# Altium footprint library мс отечественные.PcbLib: 15 footprints
Each footprint in its own frame and in the unit in brackets; x right, y up, seen from the top. Pads: shape width x height; smd on the part's side, far side on the other; paste and mask are expansions set on the pad; w line width, h text height; cw(c..) or ccw(c..) is an arc to the next point about the centre after c.
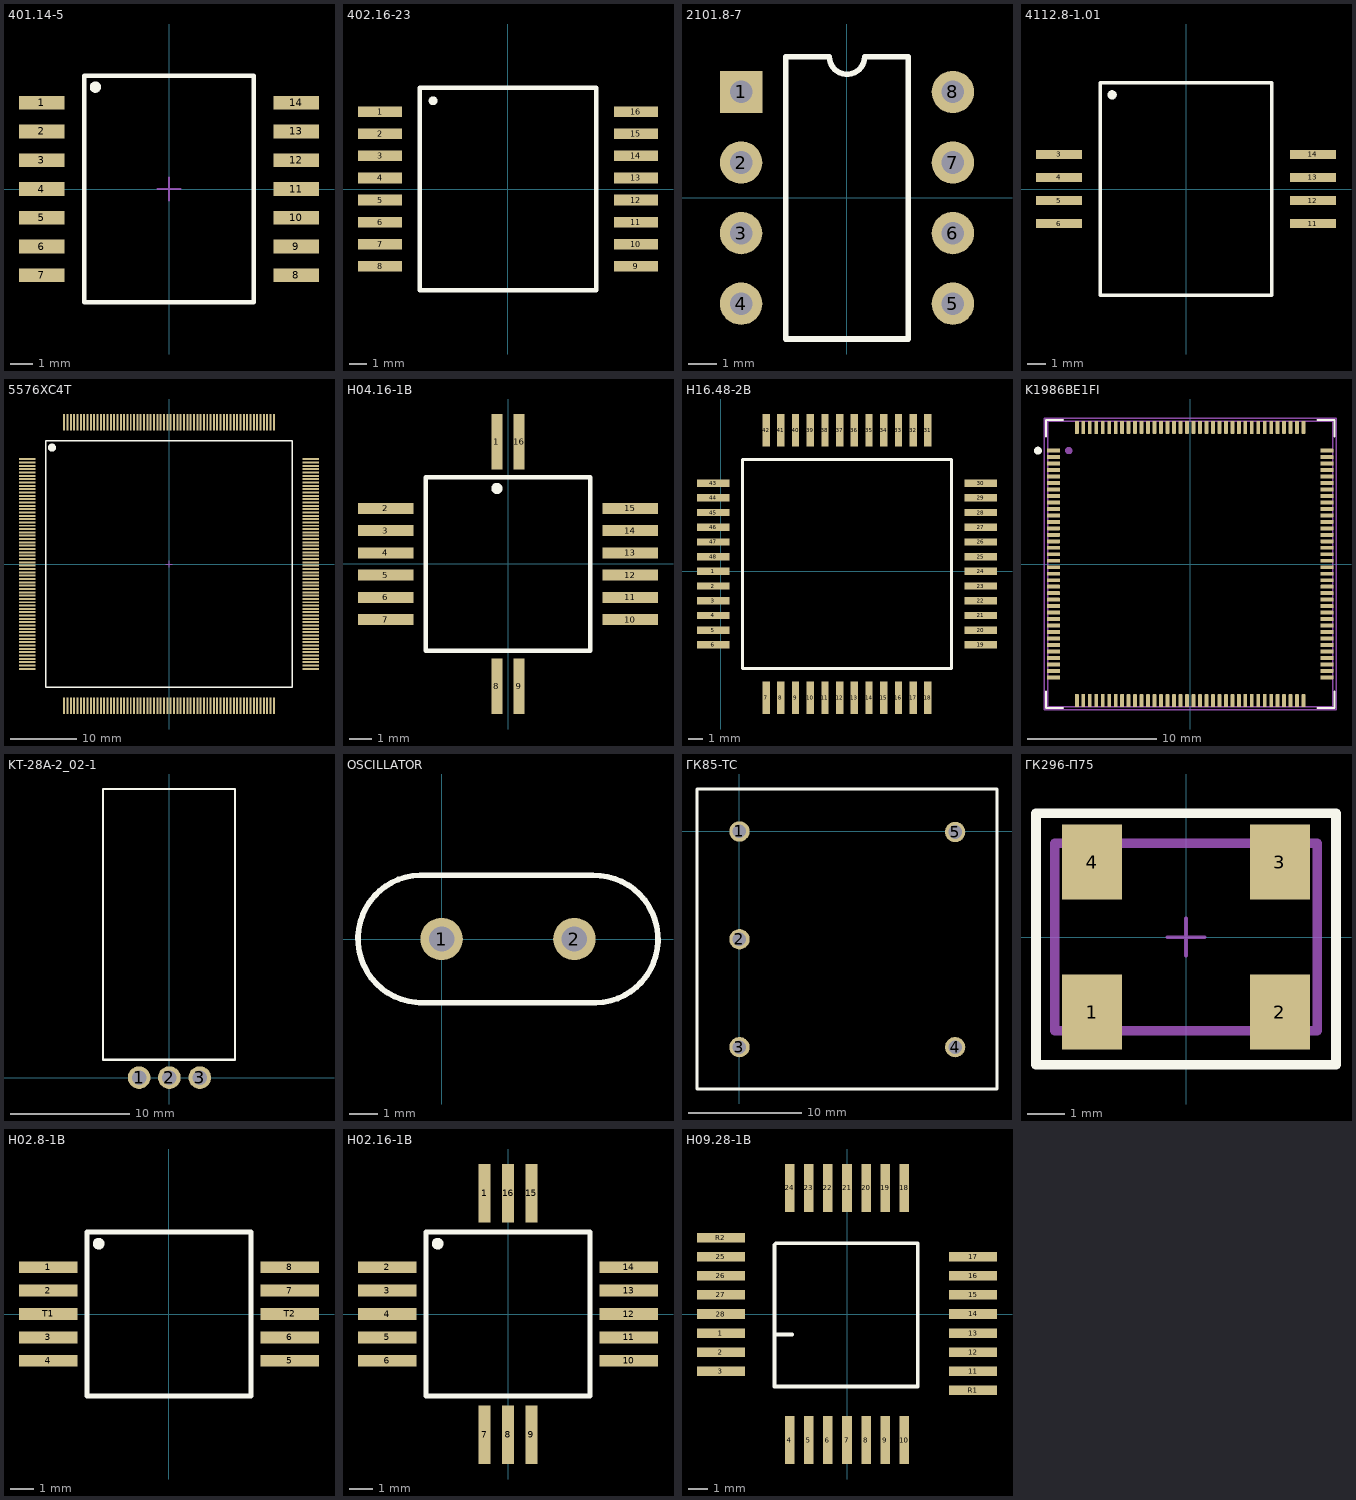
[diagram p0: the footprints below, top view; thin cyan lines are the x and y axes]

## 401.14-5 [mm]
pads (14):
  rect 2x0.6 smd: 1(-5.625,3.81) 2(-5.625,2.54) 3(-5.625,1.27) 4(-5.625,0) 5(-5.625,-1.27) 6(-5.625,-2.54) 7(-5.625,-3.81) 8(5.625,-3.81) 9(5.625,-2.54) 10(5.625,-1.27) 11(5.625,0) 12(5.625,1.27) 13(5.625,2.54) 14(5.625,3.81)
Top Overlay:
  circle w0.25: c-3.25,4.5 r0.125
  lines w0.2: -3.75,-5 -3.75,5 3.75,5 3.75,-5 -3.75,-5
Mechanical 15:
  lines w0.1: -0.5,0 0.5,0 ; 0,-0.5 0,0.5
3D body "401.14-5.STEP": height 2.65, standoff 0, extent -6.126,-5 6.125,5

## 402.16-23 [mm]
pads (16):
  rect 2.5x0.6 smd: 1(-7.25,4.375) 2(-7.25,3.125) 3(-7.25,1.875) 4(-7.25,0.625) 5(-7.25,-0.625) 6(-7.25,-1.875) 7(-7.25,-3.125) 8(-7.25,-4.375) 9(7.25,-4.375) 10(7.25,-3.125) 11(7.25,-1.875) 12(7.25,-0.625) 13(7.25,0.625) 14(7.25,1.875) 15(7.25,3.125) 16(7.25,4.375)
Top Overlay:
  circle w0.25: c-4.25,5 r0.125
  lines w0.254: -5,-5.75 5,-5.75 5,5.75 -5,5.75 -5,-5.75
3D body "402_16.STEP": height 2.51, standoff 0, extent -7.25,-5.75 7.25,5.75

## 2101.8-7 [mm]
pads (8):
  rect 1.5x1.5 hole 0.8: 1(-3.75,3.75)
  round 1.5 hole 0.8: 2(-3.75,1.25) 3(-3.75,-1.25) 4(-3.75,-3.75) 5(3.75,-3.75) 6(3.75,-1.25) 7(3.75,1.25) 8(3.75,3.75)
Top Overlay:
  lines w0.2: -2.165,-5 -2.165,5 -0.625,5 ccw(c0,5) 0.625,5 2.165,5 2.165,-5 -2.165,-5
3D body "2101.8-7.STEP": height 4.89, standoff -2.31, extent -3.91,-5 3.91,5

## 4112.8-1.01 [mm]
pads (8):
  rect 2.5x0.5 smd: 3(-6.875,1.875) 4(-6.875,0.625) 5(-6.875,-0.625) 6(-6.875,-1.875) 11(6.875,-1.875) 12(6.875,-0.625) 13(6.875,0.625) 14(6.875,1.875)
Top Overlay:
  circle w0.25: c-4,5.1 r0.125
  lines w0.2: -4.65,-5.75 4.65,-5.75 4.65,5.75 -4.65,5.75 -4.65,-5.75
3D body "4112_8-1_01.STEP": height 2.51, standoff 0.01, extent -7.15,-5.75 7.15,5.75

## 5576XC4T [mm]
pads (256):
  rect 2.5x0.3 smd: 1(-21.3,15.75) 2(-21.3,15.25) 3(-21.3,14.75) 4(-21.3,14.25) 5(-21.3,13.75) 6(-21.3,13.25) 7(-21.3,12.75) 8(-21.3,12.25) 9(-21.3,11.75) 10(-21.3,11.25) 11(-21.3,10.75) 12(-21.3,10.25) 13(-21.3,9.75) 14(-21.3,9.25) 15(-21.3,8.75) 16(-21.3,8.25) 17(-21.3,7.75) 18(-21.3,7.25) 19(-21.3,6.75) 20(-21.3,6.25) 21(-21.3,5.75) 22(-21.3,5.25) 23(-21.3,4.75) 24(-21.3,4.25) 25(-21.3,3.75) 26(-21.3,3.25) 27(-21.3,2.75) 28(-21.3,2.25) 29(-21.3,1.75) 30(-21.3,1.25) 31(-21.3,0.75) 32(-21.3,0.25) 33(-21.3,-0.25) 34(-21.3,-0.75) 35(-21.3,-1.25) 36(-21.3,-1.75) 37(-21.3,-2.25) 38(-21.3,-2.75) 39(-21.3,-3.25) 40(-21.3,-3.75) 41(-21.3,-4.25) 42(-21.3,-4.75) 43(-21.3,-5.25) 44(-21.3,-5.75) 45(-21.3,-6.25) 46(-21.3,-6.75) 47(-21.3,-7.25) 48(-21.3,-7.75) 49(-21.3,-8.25) 50(-21.3,-8.75) 51(-21.3,-9.25) 52(-21.3,-9.75) 53(-21.3,-10.25) 54(-21.3,-10.75) 55(-21.3,-11.25) 56(-21.3,-11.75) 57(-21.3,-12.25) 58(-21.3,-12.75) 59(-21.3,-13.25) 60(-21.3,-13.75) 61(-21.3,-14.25) 62(-21.3,-14.75) 63(-21.3,-15.25) 64(-21.3,-15.75) 129(21.3,-15.75) 130(21.3,-15.25) 131(21.3,-14.75) 132(21.3,-14.25) 133(21.3,-13.75) 134(21.3,-13.25) 135(21.3,-12.75) 136(21.3,-12.25) 137(21.3,-11.75) 138(21.3,-11.25) 139(21.3,-10.75) 140(21.3,-10.25) 141(21.3,-9.75) 142(21.3,-9.25) 143(21.3,-8.75) 144(21.3,-8.25) 145(21.3,-7.75) 146(21.3,-7.25) 147(21.3,-6.75) 148(21.3,-6.25) 149(21.3,-5.75) 150(21.3,-5.25) 151(21.3,-4.75) 152(21.3,-4.25) 153(21.3,-3.75) 154(21.3,-3.25) 155(21.3,-2.75) 156(21.3,-2.25) 157(21.3,-1.75) 158(21.3,-1.25) 159(21.3,-0.75) 160(21.3,-0.25) 161(21.3,0.25) 162(21.3,0.75) 163(21.3,1.25) 164(21.3,1.75) 165(21.3,2.25) 166(21.3,2.75) 167(21.3,3.25) 168(21.3,3.75) 169(21.3,4.25) 170(21.3,4.75) 171(21.3,5.25) 172(21.3,5.75) 173(21.3,6.25) 174(21.3,6.75) 175(21.3,7.25) 176(21.3,7.75) 177(21.3,8.25) 178(21.3,8.75) 179(21.3,9.25) 180(21.3,9.75) 181(21.3,10.25) 182(21.3,10.75) 183(21.3,11.25) 184(21.3,11.75) 185(21.3,12.25) 186(21.3,12.75) 187(21.3,13.25) 188(21.3,13.75) 189(21.3,14.25) 190(21.3,14.75) 191(21.3,15.25) 192(21.3,15.75)
  rect 0.3x2.5 smd: 65(-15.75,-21.3) 66(-15.25,-21.3) 67(-14.75,-21.3) 68(-14.25,-21.3) 69(-13.75,-21.3) 70(-13.25,-21.3) 71(-12.75,-21.3) 72(-12.25,-21.3) 73(-11.75,-21.3) 74(-11.25,-21.3) 75(-10.75,-21.3) 76(-10.25,-21.3) 77(-9.75,-21.3) 78(-9.25,-21.3) 79(-8.75,-21.3) 80(-8.25,-21.3) 81(-7.75,-21.3) 82(-7.25,-21.3) 83(-6.75,-21.3) 84(-6.25,-21.3) 85(-5.75,-21.3) 86(-5.25,-21.3) 87(-4.75,-21.3) 88(-4.25,-21.3) 89(-3.75,-21.3) 90(-3.25,-21.3) 91(-2.75,-21.3) 92(-2.25,-21.3) 93(-1.75,-21.3) 94(-1.25,-21.3) 95(-0.75,-21.3) 96(-0.25,-21.3) 97(0.25,-21.3) 98(0.75,-21.3) 99(1.25,-21.3) 100(1.75,-21.3) 101(2.25,-21.3) 102(2.75,-21.3) 103(3.25,-21.3) 104(3.75,-21.3) 105(4.25,-21.3) 106(4.75,-21.3) 107(5.25,-21.3) 108(5.75,-21.3) 109(6.25,-21.3) 110(6.75,-21.3) 111(7.25,-21.3) 112(7.75,-21.3) 113(8.25,-21.3) 114(8.75,-21.3) 115(9.25,-21.3) 116(9.75,-21.3) 117(10.25,-21.3) 118(10.75,-21.3) 119(11.25,-21.3) 120(11.75,-21.3) 121(12.25,-21.3) 122(12.75,-21.3) 123(13.25,-21.3) 124(13.75,-21.3) 125(14.25,-21.3) 126(14.75,-21.3) 127(15.25,-21.3) 128(15.75,-21.3) 193(15.75,21.3) 194(15.25,21.3) 195(14.75,21.3) 196(14.25,21.3) 197(13.75,21.3) 198(13.25,21.3) 199(12.75,21.3) 200(12.25,21.3) 201(11.75,21.3) 202(11.25,21.3) 203(10.75,21.3) 204(10.25,21.3) 205(9.75,21.3) 206(9.25,21.3) 207(8.75,21.3) 208(8.25,21.3) 209(7.75,21.3) 210(7.25,21.3) 211(6.75,21.3) 212(6.25,21.3) 213(5.75,21.3) 214(5.25,21.3) 215(4.75,21.3) 216(4.25,21.3) 217(3.75,21.3) 218(3.25,21.3) 219(2.75,21.3) 220(2.25,21.3) 221(1.75,21.3) 222(1.25,21.3) 223(0.75,21.3) 224(0.25,21.3) 225(-0.25,21.3) 226(-0.75,21.3) 227(-1.25,21.3) 228(-1.75,21.3) 229(-2.25,21.3) 230(-2.75,21.3) 231(-3.25,21.3) 232(-3.75,21.3) 233(-4.25,21.3) 234(-4.75,21.3) 235(-5.25,21.3) 236(-5.75,21.3) 237(-6.25,21.3) 238(-6.75,21.3) 239(-7.25,21.3) 240(-7.75,21.3) 241(-8.25,21.3) 242(-8.75,21.3) 243(-9.25,21.3) 244(-9.75,21.3) 245(-10.25,21.3) 246(-10.75,21.3) 247(-11.25,21.3) 248(-11.75,21.3) 249(-12.25,21.3) 250(-12.75,21.3) 251(-13.25,21.3) 252(-13.75,21.3) 253(-14.25,21.3) 254(-14.75,21.3) 255(-15.25,21.3) 256(-15.75,21.3)
Top Overlay:
  circle w0.6: c-17.6,17.5 r0.3
  lines w0.2: -18.5,-18.5 18.5,-18.5 18.5,18.5 -18.5,18.5 -18.5,-18.5
Mechanical 15:
  lines w0.1: -0.5,0 0.5,0 ; 0,-0.5 0,0.5
3D body "5576XC4.STEP": height 3.26, standoff 0, extent -21.4,-21.4 21.4,21.4

## H04.16-1B [mm]
pads (16):
  rect 0.5x2.5 smd: 1(-0.5,5.5) 8(-0.5,-5.5) 9(0.5,-5.5) 16(0.5,5.5)
  rect 2.5x0.5 smd: 2(-5.5,2.5) 3(-5.5,1.5) 4(-5.5,0.5) 5(-5.5,-0.5) 6(-5.5,-1.5) 7(-5.5,-2.5) 10(5.5,-2.5) 11(5.5,-1.5) 12(5.5,-0.5) 13(5.5,0.5) 14(5.5,1.5) 15(5.5,2.5)
Top Overlay:
  circle w0.25: c-0.5,3.4 r0.125
  lines w0.2: -3.7,-3.9 -3.7,3.9 3.7,3.9 3.7,-3.9 -3.7,-3.9
3D body "H04.16-1B-.STEP": height 2.46, standoff -0.04, extent -5.695,-5.91 5.705,5.89

## H16.48-2B [mm]
pads (48):
  rect 2.2x0.5 smd: 1(-0.5,0) 2(-0.5,-1) 3(-0.5,-2) 4(-0.5,-3) 5(-0.5,-4) 6(-0.5,-5) 19(17.7,-5) 20(17.7,-4) 21(17.7,-3) 22(17.7,-2) 23(17.7,-1) 24(17.7,0) 25(17.7,1) 26(17.7,2) 27(17.7,3) 28(17.7,4) 29(17.7,5) 30(17.7,6) 43(-0.5,6) 44(-0.5,5) 45(-0.5,4) 46(-0.5,3) 47(-0.5,2) 48(-0.5,1)
  rect 0.5x2.2 smd: 7(3.1,-8.6) 8(4.1,-8.6) 9(5.1,-8.6) 10(6.1,-8.6) 11(7.1,-8.6) 12(8.1,-8.6) 13(9.1,-8.6) 14(10.1,-8.6) 15(11.1,-8.6) 16(12.1,-8.6) 17(13.1,-8.6) 18(14.1,-8.6) 31(14.1,9.6) 32(13.1,9.6) 33(12.1,9.6) 34(11.1,9.6) 35(10.1,9.6) 36(9.1,9.6) 37(8.1,9.6) 38(7.1,9.6) 39(6.1,9.6) 40(5.1,9.6) 41(4.1,9.6) 42(3.1,9.6)
Top Overlay:
  lines w0.2: 1.5,-6.6 15.7,-6.6 15.7,7.6 1.5,7.6 1.5,-6.6
3D body "H16.48-2B.STEP": height 2.8, standoff 0, extent -1,-9.1 18.2,10.1

## K1986BE1FI [mm] "QFN144 22x22x1,6(0,5)"
height 1.6
pads (144):
  rect 1x0.3 smd mask+0.05: 1(-10.55,8.75)
  rrect25% 1x0.3 smd mask+0.05: 2(-10.55,8.25) 3(-10.55,7.75) 4(-10.55,7.25) 5(-10.55,6.75) 6(-10.55,6.25) 7(-10.55,5.75) 8(-10.55,5.25) 9(-10.55,4.75) 10(-10.55,4.25) 11(-10.55,3.75) 12(-10.55,3.25) 13(-10.55,2.75) 14(-10.55,2.25) 15(-10.55,1.75) 16(-10.55,1.25) 17(-10.55,0.75) 18(-10.55,0.25) 19(-10.55,-0.25) 20(-10.55,-0.75) 21(-10.55,-1.25) 22(-10.55,-1.75) 23(-10.55,-2.25) 24(-10.55,-2.75) 25(-10.55,-3.25) 26(-10.55,-3.75) 27(-10.55,-4.25) 28(-10.55,-4.75) 29(-10.55,-5.25) 30(-10.55,-5.75) 31(-10.55,-6.25) 32(-10.55,-6.75) 33(-10.55,-7.25) 34(-10.55,-7.75) 35(-10.55,-8.25) 36(-10.55,-8.75) 73(10.55,-8.75) 74(10.55,-8.25) 75(10.55,-7.75) 76(10.55,-7.25) 77(10.55,-6.75) 78(10.55,-6.25) 79(10.55,-5.75) 80(10.55,-5.25) 81(10.55,-4.75) 82(10.55,-4.25) 83(10.55,-3.75) 84(10.55,-3.25) 85(10.55,-2.75) 86(10.55,-2.25) 87(10.55,-1.75) 88(10.55,-1.25) 89(10.55,-0.75) 90(10.55,-0.25) 91(10.55,0.25) 92(10.55,0.75) 93(10.55,1.25) 94(10.55,1.75) 95(10.55,2.25) 96(10.55,2.75) 97(10.55,3.25) 98(10.55,3.75) 99(10.55,4.25) 100(10.55,4.75) 101(10.55,5.25) 102(10.55,5.75) 103(10.55,6.25) 104(10.55,6.75) 105(10.55,7.25) 106(10.55,7.75) 107(10.55,8.25) 108(10.55,8.75)
  rrect25% 0.3x1 smd mask+0.05: 37(-8.75,-10.55) 38(-8.25,-10.55) 39(-7.75,-10.55) 40(-7.25,-10.55) 41(-6.75,-10.55) 42(-6.25,-10.55) 43(-5.75,-10.55) 44(-5.25,-10.55) 45(-4.75,-10.55) 46(-4.25,-10.55) 47(-3.75,-10.55) 48(-3.25,-10.55) 49(-2.75,-10.55) 50(-2.25,-10.55) 51(-1.75,-10.55) 52(-1.25,-10.55) 53(-0.75,-10.55) 54(-0.25,-10.55) 55(0.25,-10.55) 56(0.75,-10.55) 57(1.25,-10.55) 58(1.75,-10.55) 59(2.25,-10.55) 60(2.75,-10.55) 61(3.25,-10.55) 62(3.75,-10.55) 63(4.25,-10.55) 64(4.75,-10.55) 65(5.25,-10.55) 66(5.75,-10.55) 67(6.25,-10.55) 68(6.75,-10.55) 69(7.25,-10.55) 70(7.75,-10.55) 71(8.25,-10.55) 72(8.75,-10.55) 109(8.75,10.55) 110(8.25,10.55) 111(7.75,10.55) 112(7.25,10.55) 113(6.75,10.55) 114(6.25,10.55) 115(5.75,10.55) 116(5.25,10.55) 117(4.75,10.55) 118(4.25,10.55) 119(3.75,10.55) 120(3.25,10.55) 121(2.75,10.55) 122(2.25,10.55) 123(1.75,10.55) 124(1.25,10.55) 125(0.75,10.55) 126(0.25,10.55) 127(-0.25,10.55) 128(-0.75,10.55) 129(-1.25,10.55) 130(-1.75,10.55) 131(-2.25,10.55) 132(-2.75,10.55) 133(-3.25,10.55) 134(-3.75,10.55) 135(-4.25,10.55) 136(-4.75,10.55) 137(-5.25,10.55) 138(-5.75,10.55) 139(-6.25,10.55) 140(-6.75,10.55) 141(-7.25,10.55) 142(-7.75,10.55) 143(-8.25,10.55) 144(-8.75,10.55)
Top Overlay:
  circle w0.3: c-11.75,8.75 r0.15
  lines w0.15: -11.125,-9.825 -11.125,-11.125 -9.825,-11.125 ; -11.125,9.825 -11.125,11.125 -9.825,11.125 ; 9.825,-11.125 11.125,-11.125 11.125,-9.825 ; 9.825,11.125 11.125,11.125 11.125,9.825
Mechanical 3:
  circle w0.3: c-9.375,8.75 r0.127
  lines w0.1: -11,-11 11,-11 11,11 -11,11 -11,-11
Mechanical 5:
  lines w0.1: -11.25,-11.25 11.25,-11.25 11.25,11.25 -11.25,11.25 -11.25,-11.25
3D body "Микросхема интегральная К1986ВЕ1FI_214.STEP": height 1.8, standoff 0, extent -11,-11 11,11

## KT-28A-2_02-1 [mm]
pads (3):
  round 1.9 hole 1.2: 1(-2.537,0) 2(-0.012,0) 3(2.538,0)
Top Overlay:
  lines w0.2: -5.561,1.5 -5.561,24.157 5.439,24.157 ; -5.512,1.5 5.488,1.5 5.488,24.157
3D body "KT-28A-2_02-1.STEP": height 5.15, standoff -4, extent -5.401,-0.475 5.401,23.9

## OSCILLATOR [mm]
pads (2):
  round 1.5 hole 0.9: 1(0,0) 2(4.7,0)
Top Overlay:
  lines w0.2: -0.8,-2.262 5.46,-2.262 ccw(c5.401,-0.006) 5.35,2.25 -0.76,2.25 ; -0.76,2.262 ccw(c-0.701,0.006) -0.65,-2.25
3D body "HC-49.STEP": height 3.52, standoff -2.98, extent -2.973,-2.379 7.827,2.121

## ГК85-ТС [mm]
pads (5):
  round 1.8 hole 1.2: 1(0,0) 2(0,-9.525) 3(0,-19.05) 4(19.05,-19.05) 5(19.05,-0.05)
Top Overlay:
  lines w0.254: -3.75,-22.75 -3.75,3.75 22.75,3.75 22.75,-22.75 -3.75,-22.75
3D body "ГК85-ТС.STEP": height 12.7, standoff -1.65, extent -3.175,-22.225 22.225,3.175

## ГК296-П75 [mm]
pads (4):
  rect 1.6x2 smd: 1(-2.5,-2) 2(2.5,-2) 3(2.5,2) 4(-2.5,2)
Top Overlay:
  lines w0.254: -4,-3.4 -4,3.3 4,3.3 4,-3.4 -4,-3.4
Mechanical 15:
  lines w0.1: -0.5,0 0.5,0 ; 0,-0.5 0,0.5
  lines w0.254: -3.5,-2.5 3.5,-2.5 3.5,2.5 -3.5,2.5 -3.5,-2.5
3D body "KXO-97V.step": height 1.3, standoff 0, extent -3.5,-2.54 3.5,2.54

## Н02.8-1В [mm]
pads (10):
  rect 2.5x0.5 smd: 1(-5.15,2) 2(-5.15,1) 3(-5.15,-1) 4(-5.15,-2) 5(5.15,-2) 6(5.15,-1) 7(5.15,1) 8(5.15,2) T1(-5.15,0) T2(5.15,0)
Top Overlay:
  circle w0.25: c-3,3 r0.125
  lines w0.2: -3.5,-3.5 -3.5,3.5 3.5,3.5 3.5,-3.5 -3.5,-3.5
3D body "H02.8-1B1.STEP": height 2.85, standoff -0.2, extent -4.75,-3.25 4.75,3.25

## Н02.16-1В [mm]
pads (16):
  rect 0.5x2.5 smd: 1(-1,5.15) 7(-1,-5.15) 8(0,-5.15) 9(1,-5.15) 15(1,5.15) 16(0,5.15)
  rect 2.5x0.5 smd: 2(-5.15,2) 3(-5.15,1) 4(-5.15,0) 5(-5.15,-1) 6(-5.15,-2) 10(5.15,-2) 11(5.15,-1) 12(5.15,0) 13(5.15,1) 14(5.15,2)
Top Overlay:
  circle w0.25: c-3,3 r0.125
  lines w0.2: -3.5,-3.5 -3.5,3.5 3.5,3.5 3.5,-3.5 -3.5,-3.5
3D body "H02.16-1B.STEP": height 3.36, standoff 0.01, extent -5.553,-5.468 5.547,5.441

## Н09.28-1В [mm]
pads (30):
  rect 2.5x0.5 smd: 1(-6.6,-1) 2(-6.6,-2) 3(-6.6,-3) 11(6.6,-3) 12(6.6,-2) 13(6.6,-1) 14(6.6,0) 15(6.6,1) 16(6.6,2) 17(6.6,3) 25(-6.6,3) 26(-6.6,2) 27(-6.6,1) 28(-6.6,0) R1(6.6,-4) R2(-6.6,4)
  rect 0.5x2.5 smd: 4(-3,-6.6) 5(-2,-6.6) 6(-1,-6.6) 7(0,-6.6) 8(1,-6.6) 9(2,-6.6) 10(3,-6.6) 18(3,6.6) 19(2,6.6) 20(1,6.6) 21(0,6.6) 22(-1,6.6) 23(-2,6.6) 24(-3,6.6)
Top Overlay:
  lines w0.2: -3.8,3.625 -3.8,-3.8 3.7,-3.8 3.7,3.7 -3.725,3.7 ; -3.7,-1.075 -2.875,-1.075
3D body "H09.28-1B.STEP": height 3.36, standoff 0.01, extent -7.003,-7.018 7,6.983